# Altium footprint library ICgeneral.PCBLIB: 48 footprints (part 1 of 3)
Each footprint in its own frame and in the unit in brackets; x right, y up, seen from the top. Pads: shape width x height; smd on the part's side, far side on the other; paste and mask are expansions set on the pad; w line width, h text height; cw(c..) or ccw(c..) is an arc to the next point about the centre after c.
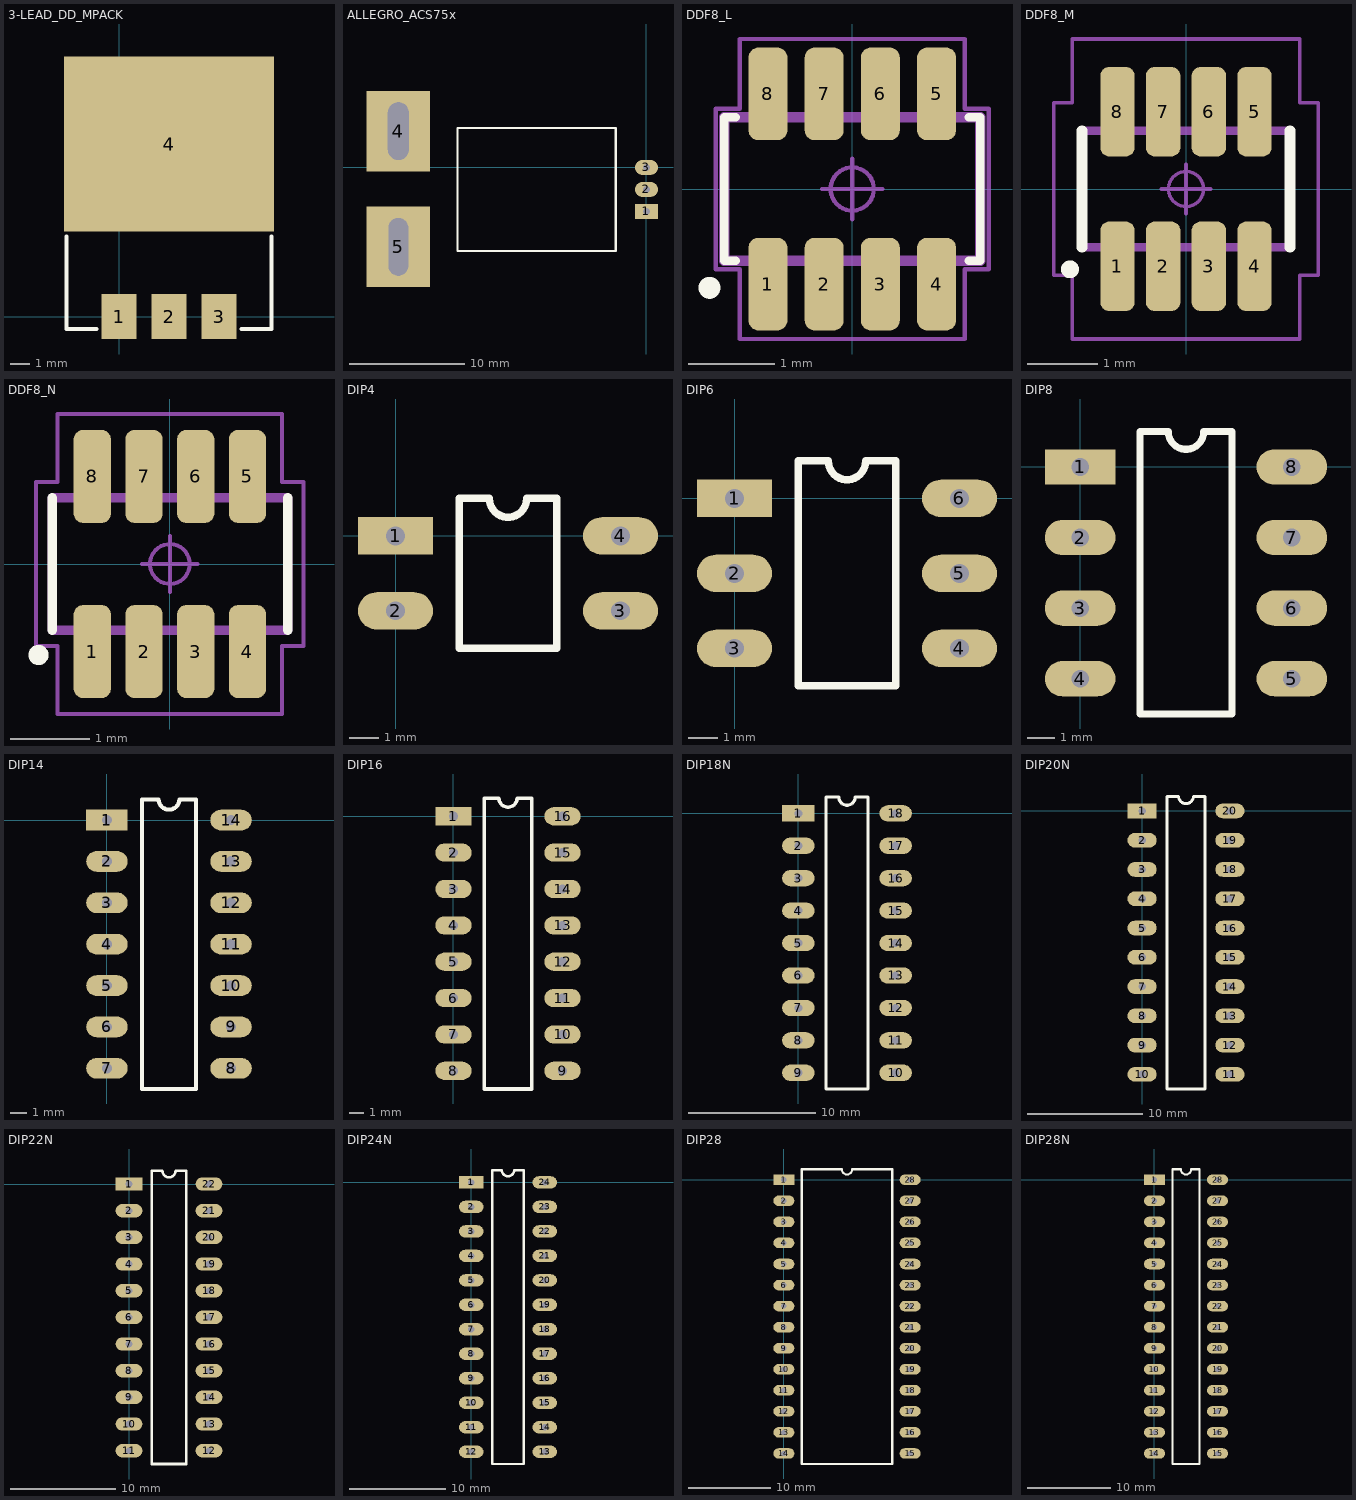
[diagram p0: the footprints below, top view; thin cyan lines are the x and y axes]

## 3-LEAD_DD_MPACK [mil]
pads (4):
  rect 70x90 smd: 1(0,0) 2(100,0) 3(200,0)
  rect 420x350 smd: 4(100,345)
Top Overlay:
  lines w8: -105,160 -105,-25 -45,-25 ; 245,-25 305,-25 305,160
Top DesignatorDoc:
  text ".Designator" at 100,75 h59.06

## ALLEGRO_ACS75x [mm]
pads (5):
  rect 2x1.3 hole 0.6: 1(0,-3.8)
  oval 2x1.3 hole 0.6: 2(0,-1.9) 3(0,0)
  rect 5.5x7 hole 1.8 slot 5 at 90 deg: 4(-21.514,3.15)
  rect 5.5x7 hole 1.7 slot 5 at 90 deg: 5(-21.514,-6.883)
Top Overlay:
  lines w0.2: -16.383,-7.239 -2.667,-7.239 -2.667,3.429 -16.383,3.429 -16.383,-7.239
Top DesignatorDoc:
  text ".Designator" at -10.16,-1.905 h1.5
3D body "User Library-ACS754SCB-200-PFF.step": height 7.02, standoff -3.49, extent -22.314,-8.895 0.508,5.105

## DDF8_L [mm] "Small Outline Pkg (SOP), 0.65 mm pitch; 8 pin, 2.90 mm L X 1.60 mm W X 1.10 mm H body"
height 1.1
pads (8):
  rrect49% 0.45x1.07 smd: 1(-0.975,-1.1) 2(-0.325,-1.1) 3(0.325,-1.1) 4(0.975,-1.1) 5(0.975,1.1) 6(0.325,1.1) 7(-0.325,1.1) 8(-0.975,1.1)
Top Overlay:
  circle w0.152: c-1.651,-1.143 r0.051
  lines w0.1: -1.35,-0.83 -1.48,-0.83 -1.48,0.83 -1.35,0.83 ; 1.35,-0.83 1.48,-0.83 1.48,0.83 1.35,0.83
Top Dimensions:
  lines w0.12: -1.48,-0.83 -1.48,0.83 1.48,0.83 1.48,-0.83 -1.48,-0.83
Bottom Dimensions:
  lines w0.025: -1.45,-0.8 -1.45,0.8 1.45,0.8 1.45,-0.8 -1.45,-0.8 ; -1.125,-1.4 -0.825,-1.4 -0.825,-0.95 -1.125,-0.95 -1.125,-1.4 ; -1.125,0.95 -0.825,0.95 -0.825,1.4 -1.125,1.4 -1.125,0.95 ; -0.475,-1.4 -0.175,-1.4 -0.175,-0.95 -0.475,-0.95 -0.475,-1.4 ; -0.475,0.95 -0.175,0.95 -0.175,1.4 -0.475,1.4 -0.475,0.95 ; 0.175,-1.4 0.475,-1.4 0.475,-0.95 0.175,-0.95 0.175,-1.4 ; 0.175,0.95 0.475,0.95 0.475,1.4 0.175,1.4 0.175,0.95 ; 0.825,-1.4 1.125,-1.4 1.125,-0.95 0.825,-0.95 0.825,-1.4 ; 0.825,0.95 1.125,0.95 1.125,1.4 0.825,1.4 0.825,0.95
Courtyard Top:
  circle w0.05: c0,0 r0.25
  lines w0.05: -0.35,0 0.35,0 ; 0,-0.35 0,0.35 ; -1.58,-0.93 -1.58,0.93 -1.3,0.93 -1.3,1.735 1.3,1.735 1.3,0.93 1.58,0.93 1.58,-0.93 1.3,-0.93 1.3,-1.735 -1.3,-1.735 -1.3,-0.93 -1.58,-0.93
Top DesignatorDoc:
  text ".Designator" at 0,0 h1
3D body "DDF8_L.STEP": height 1.1, standoff 0, extent -1.45,-1.4 1.45,1.4

## DDF8_M [mm] "Small Outline Pkg (SOP), 0.65 mm pitch; 8 pin, 2.90 mm L X 1.60 mm W X 1.10 mm H body"
height 1.1
pads (8):
  rrect49% 0.49x1.27 smd: 1(-0.975,-1.1) 2(-0.325,-1.1) 3(0.325,-1.1) 4(0.975,-1.1) 5(0.975,1.1) 6(0.325,1.1) 7(-0.325,1.1) 8(-0.975,1.1)
Top Overlay:
  circle w0.152: c-1.651,-1.143 r0.051
  lines w0.15: -1.48,-0.83 -1.48,0.83 ; 1.48,-0.83 1.48,0.83
Top Dimensions:
  lines w0.12: -1.48,-0.83 1.48,-0.83 1.48,0.83 -1.48,0.83 -1.48,-0.83
Bottom Dimensions:
  lines w0.025: -1.45,-0.8 1.45,-0.8 1.45,0.8 -1.45,0.8 -1.45,-0.8 ; -1.125,-1.4 -1.125,-0.95 -0.825,-0.95 -0.825,-1.4 -1.125,-1.4 ; -1.125,0.95 -1.125,1.4 -0.825,1.4 -0.825,0.95 -1.125,0.95 ; -0.475,-1.4 -0.475,-0.95 -0.175,-0.95 -0.175,-1.4 -0.475,-1.4 ; -0.475,0.95 -0.475,1.4 -0.175,1.4 -0.175,0.95 -0.475,0.95 ; 0.175,-1.4 0.175,-0.95 0.475,-0.95 0.475,-1.4 0.175,-1.4 ; 0.175,0.95 0.175,1.4 0.475,1.4 0.475,0.95 0.175,0.95 ; 0.825,-1.4 0.825,-0.95 1.125,-0.95 1.125,-1.4 0.825,-1.4 ; 0.825,0.95 0.825,1.4 1.125,1.4 1.125,0.95 0.825,0.95
Courtyard Top:
  circle w0.05: c0,0 r0.25
  lines w0.05: -0.35,0 0.35,0 ; 0,-0.35 0,0.35 ; -1.88,-1.23 -1.62,-1.23 -1.62,-2.135 1.62,-2.135 1.62,-1.23 1.88,-1.23 1.88,1.23 1.62,1.23 1.62,2.135 -1.62,2.135 -1.62,1.23 -1.88,1.23 -1.88,-1.23
Top DesignatorDoc:
  text ".Designator" at 0,0 h1.5
3D body "DDF8_M.STEP": height 1.1, standoff 0, extent -1.45,-1.4 1.45,1.4

## DDF8_N [mm] "Small Outline Pkg (SOP), 0.65 mm pitch; 8 pin, 2.90 mm L X 1.60 mm W X 1.10 mm H body"
height 1.1
pads (8):
  rrect51% 0.47x1.17 smd: 1(-0.975,-1.1) 2(-0.325,-1.1) 3(0.325,-1.1) 4(0.975,-1.1) 5(0.975,1.1) 6(0.325,1.1) 7(-0.325,1.1) 8(-0.975,1.1)
Top Overlay:
  circle w0.152: c-1.651,-1.143 r0.051
  lines w0.12: -1.48,-0.83 -1.48,0.83 ; 1.48,-0.83 1.48,0.83
Top Dimensions:
  lines w0.12: -1.48,-0.83 -1.48,0.83 1.48,0.83 1.48,-0.83 -1.48,-0.83
Bottom Dimensions:
  lines w0.025: -1.45,-0.8 -1.45,0.8 1.45,0.8 1.45,-0.8 -1.45,-0.8 ; -1.125,-1.4 -0.825,-1.4 -0.825,-0.95 -1.125,-0.95 -1.125,-1.4 ; -1.125,0.95 -0.825,0.95 -0.825,1.4 -1.125,1.4 -1.125,0.95 ; -0.475,-1.4 -0.175,-1.4 -0.175,-0.95 -0.475,-0.95 -0.475,-1.4 ; -0.475,0.95 -0.175,0.95 -0.175,1.4 -0.475,1.4 -0.475,0.95 ; 0.175,-1.4 0.475,-1.4 0.475,-0.95 0.175,-0.95 0.175,-1.4 ; 0.175,0.95 0.475,0.95 0.475,1.4 0.175,1.4 0.175,0.95 ; 0.825,-1.4 1.125,-1.4 1.125,-0.95 0.825,-0.95 0.825,-1.4 ; 0.825,0.95 1.125,0.95 1.125,1.4 0.825,1.4 0.825,0.95
Courtyard Top:
  circle w0.05: c0,0 r0.25
  lines w0.05: -0.35,0 0.35,0 ; 0,-0.35 0,0.35 ; -1.68,-1.03 -1.68,1.03 -1.41,1.03 -1.41,1.885 1.41,1.885 1.41,1.03 1.68,1.03 1.68,-1.03 1.41,-1.03 1.41,-1.885 -1.41,-1.885 -1.41,-1.03 -1.68,-1.03
Top DesignatorDoc:
  text ".Designator" at 0,0 h1.2
3D body "DDF8_N.STEP": height 1.1, standoff 0, extent -1.45,-1.4 1.45,1.4

## DIP4 [mm]
pads (4):
  rect 2.54x1.27 hole 0.635: 1(0,0)
  oval 2.54x1.27 hole 0.635: 2(0,-2.54) 3(7.62,-2.54) 4(7.62,0)
Top Overlay:
  lines w0.254: 2.159,-3.81 5.461,-3.81 5.461,1.27 4.445,1.27 cw(c3.81,1.27) 3.175,1.27 2.159,1.27 2.159,-3.81
3D body "SW3DPS-DIP4-DEFAULT.step": height 4.31, standoff -3.28, extent -0.19,-4.041 7.81,1.499

## DIP6 [mm]
pads (6):
  rect 2.54x1.27 hole 0.635: 1(0,0)
  oval 2.54x1.27 hole 0.635: 2(0,-2.54) 3(0,-5.08) 4(7.62,-5.08) 5(7.62,-2.54) 6(7.62,0)
Top Overlay:
  lines w0.254: 2.159,-6.35 2.159,1.27 3.175,1.27 ccw(c3.81,1.27) 4.445,1.27 5.461,1.27 5.461,-6.35 2.159,-6.35
3D body "SW3DPS-DIP6-DEFAULT.step": height 4.31, standoff -3.28, extent -0.165,-6.553 7.835,1.527

## DIP8 [mm]
pads (8):
  rect 2.54x1.27 hole 0.635: 1(0,0)
  oval 2.54x1.27 hole 0.635: 2(0,-2.54) 3(0,-5.08) 4(0,-7.62) 5(7.62,-7.62) 6(7.62,-5.08) 7(7.62,-2.54) 8(7.62,0)
Top Overlay:
  lines w0.254: 2.159,-8.89 5.461,-8.89 5.461,1.27 4.445,1.27 cw(c3.81,1.27) 3.175,1.27 2.159,1.27 2.159,-8.89
3D body "SW3DPS-DIP 8 IC-DEFAULT.step": height 5.08, standoff -3.5, extent -0.125,-9.119 7.745,1.801

## DIP14 [mm]
pads (14):
  rect 2.54x1.27 hole 0.635: 1(0,0)
  oval 2.54x1.27 hole 0.635: 2(0,-2.54) 3(0,-5.08) 4(0,-7.62) 5(0,-10.16) 6(0,-12.7) 7(0,-15.24) 8(7.62,-15.24) 9(7.62,-12.7) 10(7.62,-10.16) 11(7.62,-7.62) 12(7.62,-5.08) 13(7.62,-2.54) 14(7.62,0)
Top Overlay:
  lines w0.254: 2.159,-16.51 5.461,-16.51 5.461,1.27 4.445,1.27 cw(c3.81,1.27) 3.175,1.27 2.159,1.27 2.159,-16.51
3D body "SW3DPS-DIP 14 IC-DEFAULT.step": height 5.1, standoff -3.3, extent -0.176,-17.638 7.694,2.362

## DIP16 [mm]
pads (16):
  rect 2.54x1.27 hole 0.635: 1(0,0)
  oval 2.54x1.27 hole 0.635: 2(0,-2.54) 3(0,-5.08) 4(0,-7.62) 5(0,-10.16) 6(0,-12.7) 7(0,-15.24) 8(0,-17.78) 9(7.62,-17.78) 10(7.62,-15.24) 11(7.62,-12.7) 12(7.62,-10.16) 13(7.62,-7.62) 14(7.62,-5.08) 15(7.62,-2.54) 16(7.62,0)
Top Overlay:
  lines w0.254: 2.159,-19.05 2.159,1.27 3.175,1.27 ccw(c3.81,1.27) 4.445,1.27 5.461,1.27 5.461,-19.05 2.159,-19.05
3D body "SW3DPS-DIP 16 IC-DEFAULT.step": height 5.1, standoff -3.3, extent -0.125,-18.73 7.745,1.27

## DIP18N [mm]
pads (18):
  rect 2.54x1.27 hole 0.635: 1(0,0)
  oval 2.54x1.27 hole 0.635: 2(0,-2.54) 3(0,-5.08) 4(0,-7.62) 5(0,-10.16) 6(0,-12.7) 7(0,-15.24) 8(0,-17.78) 9(0,-20.32) 10(7.62,-20.32) 11(7.62,-17.78) 12(7.62,-15.24) 13(7.62,-12.7) 14(7.62,-10.16) 15(7.62,-7.62) 16(7.62,-5.08) 17(7.62,-2.54) 18(7.62,0)
Top Overlay:
  lines w0.254: 2.159,-21.59 5.461,-21.59 5.461,1.27 4.445,1.27 cw(c3.81,1.27) 3.175,1.27 2.159,1.27 2.159,-21.59
3D body "User Library-DIP18-1.STEP": height 4.57, standoff -3.81, extent -0.125,-21.767 7.695,1.473

## DIP20N [mm]
pads (20):
  rect 2.54x1.27 hole 0.635: 1(0,0)
  oval 2.54x1.27 hole 0.635: 2(0,-2.54) 3(0,-5.08) 4(0,-7.62) 5(0,-10.16) 6(0,-12.7) 7(0,-15.24) 8(0,-17.78) 9(0,-20.32) 10(0,-22.86) 11(7.62,-22.86) 12(7.62,-20.32) 13(7.62,-17.78) 14(7.62,-15.24) 15(7.62,-12.7) 16(7.62,-10.16) 17(7.62,-7.62) 18(7.62,-5.08) 19(7.62,-2.54) 20(7.62,0)
Top Overlay:
  lines w0.254: 2.159,-24.13 5.461,-24.13 5.461,1.27 4.445,1.27 cw(c3.81,1.27) 3.175,1.27 2.159,1.27 2.159,-24.13
3D body "User Library-DIP20.STEP": height 4.57, standoff -3.81, extent -0.125,-24.686 7.695,1.854

## DIP22N [mm]
pads (22):
  rect 2.54x1.27 hole 0.635: 1(0,0)
  oval 2.54x1.27 hole 0.635: 2(0,-2.54) 3(0,-5.08) 4(0,-7.62) 5(0,-10.16) 6(0,-12.7) 7(0,-15.24) 8(0,-17.78) 9(0,-20.32) 10(0,-22.86) 11(0,-25.4) 12(7.62,-25.4) 13(7.62,-22.86) 14(7.62,-20.32) 15(7.62,-17.78) 16(7.62,-15.24) 17(7.62,-12.7) 18(7.62,-10.16) 19(7.62,-7.62) 20(7.62,-5.08) 21(7.62,-2.54) 22(7.62,0)
Top Overlay:
  lines w0.254: 2.159,-26.67 5.461,-26.67 5.461,1.27 4.445,1.27 cw(c3.81,1.27) 3.175,1.27 2.159,1.27 2.159,-26.67
3D body "SW3dPS-DIP22P3.STEP": height 5.09, standoff -2.48, extent -0.125,-27.526 7.745,2.134

## DIP24N [mm]
pads (24):
  rect 2.54x1.27 hole 0.635: 1(0,0)
  oval 2.54x1.27 hole 0.635: 2(0,-2.54) 3(0,-5.08) 4(0,-7.62) 5(0,-10.16) 6(0,-12.7) 7(0,-15.24) 8(0,-17.78) 9(0,-20.32) 10(0,-22.86) 11(0,-25.4) 12(0,-27.94) 13(7.62,-27.94) 14(7.62,-25.4) 15(7.62,-22.86) 16(7.62,-20.32) 17(7.62,-17.78) 18(7.62,-15.24) 19(7.62,-12.7) 20(7.62,-10.16) 21(7.62,-7.62) 22(7.62,-5.08) 23(7.62,-2.54) 24(7.62,0)
Top Overlay:
  lines w0.254: 2.159,-29.21 5.461,-29.21 5.461,1.27 4.445,1.27 cw(c3.81,1.27) 3.175,1.27 2.159,1.27 2.159,-29.21
3D body "SW3DPS-SDIP24-DEFAULT.step": height 4.19, standoff -2.57, extent -0.381,-29.845 8.001,1.905

## DIP28 [mm]
pads (28):
  rect 2.54x1.27 hole 0.635: 1(0,0)
  oval 2.54x1.27 hole 0.635: 2(0,-2.54) 3(0,-5.08) 4(0,-7.62) 5(0,-10.16) 6(0,-12.7) 7(0,-15.24) 8(0,-17.78) 9(0,-20.32) 10(0,-22.86) 11(0,-25.4) 12(0,-27.94) 13(0,-30.48) 14(0,-33.02) 15(15.24,-33.02) 16(15.24,-30.48) 17(15.24,-27.94) 18(15.24,-25.4) 19(15.24,-22.86) 20(15.24,-20.32) 21(15.24,-17.78) 22(15.24,-15.24) 23(15.24,-12.7) 24(15.24,-10.16) 25(15.24,-7.62) 26(15.24,-5.08) 27(15.24,-2.54) 28(15.24,0)
Top Overlay:
  lines w0.254: 2.159,-34.29 2.159,1.27 6.985,1.27 ccw(c7.62,1.27) 8.255,1.27 13.081,1.27 13.081,-34.29 2.159,-34.29
3D body "SW3DPS-DIP28-DEFAULT.step": height 4.66, standoff -3.28, extent -0.19,-34.511 15.43,1.499

## DIP28N [mm]
pads (28):
  rect 2.54x1.27 hole 0.635: 1(0,0)
  oval 2.54x1.27 hole 0.635: 2(0,-2.54) 3(0,-5.08) 4(0,-7.62) 5(0,-10.16) 6(0,-12.7) 7(0,-15.24) 8(0,-17.78) 9(0,-20.32) 10(0,-22.86) 11(0,-25.4) 12(0,-27.94) 13(0,-30.48) 14(0,-33.02) 15(7.62,-33.02) 16(7.62,-30.48) 17(7.62,-27.94) 18(7.62,-25.4) 19(7.62,-22.86) 20(7.62,-20.32) 21(7.62,-17.78) 22(7.62,-15.24) 23(7.62,-12.7) 24(7.62,-10.16) 25(7.62,-7.62) 26(7.62,-5.08) 27(7.62,-2.54) 28(7.62,0)
Top Overlay:
  lines w0.254: 2.159,-34.29 2.159,1.27 3.175,1.27 ccw(c3.81,1.27) 4.445,1.27 5.461,1.27 5.461,-34.29 2.159,-34.29
3D body "User Library-28 pin dip-2.step": height 4.7, standoff -1.52, extent -0.127,-34.519 7.747,1.422